# Altium integrated library Cap-Cer-SMD_V2.IntLib: 957 symbols (part 7 of 7)
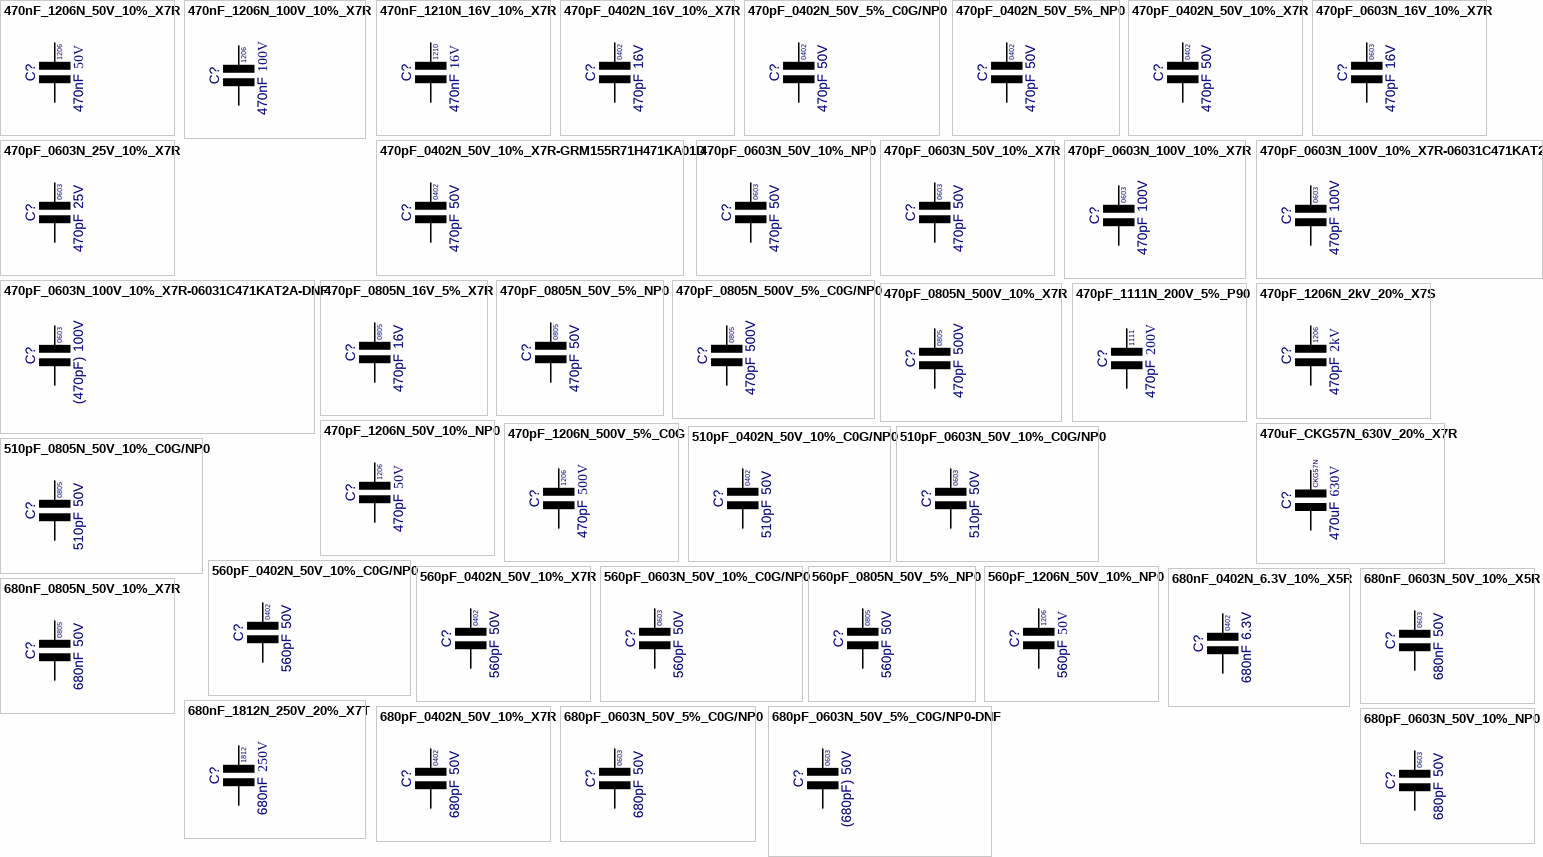
[diagram p29: symbols 470nF_1206N_50V_10%_X7R to 680pF_0603N_50V_10%_NP0]

## 470pF_0805N_16V_5%_X7R
designator C?, comment value 470pF  Voltage: 16V  Text1: 0805  (hidden comment: 470pF_C0805_16V_5%_X7R)
Cap Ceramic X7R; Manufacturer: Various; Part Number: 470pF 0805 16V 5% X7R; Tol: 5%; Package: CAPC0805X110N; EDM-PN: *; Text2: *; SAAB PN: *; DCE Part No: *
footprint CAPC0805X110N (Chip Capacitor, 0805, 2-Leads, Body 2.0x1.3mm, IPC Medium Density)
pins: 1, 2

## 470pF_0805N_50V_5%_NP0
designator C?, comment value 470pF  Voltage: 50V  Text1: 0805  (hidden comment: 470pF_C0805_50V_5%_NP0)
Cap Ceramic NP0; Manufacturer: Various; Part Number: 470pF 0805 50V 5% C0G/NP0; Tol: 5%; Package: CAPC0805X110N; EDM-PN: *; Text2: *; SAAB PN: *; DCE Part No: *
footprint CAPC0805X110N (Chip Capacitor, 0805, 2-Leads, Body 2.0x1.3mm, IPC Medium Density)
pins: 1, 2

## 470pF_0805N_500V_5%_C0G/NP0
designator C?, comment value 470pF  Voltage: 500V  Text1: 0805  (hidden comment: 470pF_C0805_500V_5%_C0G/NP0)
Cap Ceramic C0G/NP0; Manufacturer: Various; Part Number: 470pF 0805 500V 5% C0G/NP0; Tol: 5%; Package: CAPC0805X110N; EDM-PN: *; Text2: *; SAAB PN: *; DCE Part No: *
footprint CAPC0805X110N (Chip Capacitor, 0805, 2-Leads, Body 2.0x1.3mm, IPC Medium Density)
pins: 1, 2

## 470pF_0805N_500V_10%_X7R
designator C?, comment value 470pF  Voltage: 500V  Text1: 0805  (hidden comment: 470pF_C0805_500V_10%_X7R)
Cap Ceramic X7R; Manufacturer: Various; Part Number: 470pF 0805 500V 10% X7R; Tol: 10%; Package: CAPC0805X110N; EDM-PN: *; Text2: *; SAAB PN: *; DCE Part No: *
footprint CAPC0805X110N (Chip Capacitor, 0805, 2-Leads, Body 2.0x1.3mm, IPC Medium Density)
pins: 1, 2

## 470pF_1111N_200V_5%_P90
designator C?, comment value 470pF  Voltage: 200V  Text1: 1111  (hidden comment: 100B471JT200XT)
Cap Ceramic P90; Manufacturer: ATC; Tol: 5%; Part Number: 100B471JT200XT; Package: CAPC1111-100B-T; EDM-PN: *; Text2: *; SAAB PN: *; DCE Part No: *
footprint CAPC1111-100B-T (Capacitor, 1111 2.79x2.79mm)
pins: 1, 2

## 470pF_1206N_2kV_20%_X7S
designator C?, comment value 470pF  Voltage: 2kV  Text1: 1206  (hidden comment: 470pF_C1206_2kV_20%_X7S)
Cap Ceramic X7S; Manufacturer: Various; Part Number: 470pF 1206 2kV 20% X7S; Tol: 20%; Package: CAPC1206X178N; EDM-PN: *; Text2: *; SAAB PN: *; DCE Part No: *
footprint CAPC1206X178N (Chip Capacitor, 1206, 2-Leads, Body 3.2x1.6mm, IPC Medium Density)
pins: 1, 2

## 470pF_1206N_50V_10%_NP0
designator C?, comment value 470pF  Voltage: 50V  Text1: 1206  (hidden comment: 470pF_C1206_50V_10%_NP0)
Cap Ceramic NP0; Manufacturer: Various; Part Number: 470pF 1206 50V 10% C0G/NP0; Tol: 10%; Package: CAPC1206X135N; EDM-PN: *; Text2: *; SAAB PN: *; DCE Part No: *
footprint CAPC1206X135N (Chip Capacitor, 1206, 2-Leads, Body 3.2x1.6mm, IPC Medium Density)
pins: 1, 2

## 470pF_1206N_500V_5%_C0G
designator C?, comment value 470pF  Voltage: 500V  Text1: 1206  (hidden comment: 470pF_C1206_500V_5%_C0G)
Cap Ceramic C0G; Manufacturer: Various; Part Number: 470pF 1206 500V 5% C0G; Tol: 5%; Package: CAPC1206X135N; EDM-PN: *; Text2: *; SAAB PN: *; DCE Part No: *
footprint CAPC1206X135N (Chip Capacitor, 1206, 2-Leads, Body 3.2x1.6mm, IPC Medium Density)
pins: 1, 2

## 470uF_CKG57N_630V_20%_X7R
designator C?  value 470uF  Voltage: 630V  Text1: CKG57N  (hidden comment: 470uF_CKG57N_630V_20%_X7R)
Cap Ceramic X7R 2 Chip Piled; Manufacturer: TDK; Part Number: CKG57NX7R2J474M; Tol: 20%; Package: CAP-CKG57N; EDM-PN: *; Text2: *; SAAB PN: *; DCE Part No: *
footprint CAP-CKG57N (Chip Capacitor, CKG57N, 2-Leads, Body 6.5x5.5mm, IPC Medium Density)
pins: 1, 2

## 510pF_0402N_50V_10%_C0G/NP0
designator C?, comment value 510pF  Voltage: 50V  Text1: 0402  (hidden comment: 510pF_C0402_50V_10%_)
Cap Ceramic C0G/NP0; Manufacturer: Various; Part Number: 510pF 0402 50V 10% C0G/NP0; Tol: 10%; Package: CAPC0402X60N; EDM-PN: *; Text2: *; SAAB PN: *; DCE Part No: *
footprint CAPC0402X60N (Chip Capacitor, 0402, 2-Leads, Body 1.0x0.5mm, IPC Medium Density)
pins: 1, 2

## 510pF_0603N_50V_10%_C0G/NP0
designator C?, comment value 510pF  Voltage: 50V  Text1: 0603  (hidden comment: 510pF_C0603_50V_10%_C0G/NP0)
Cap Ceramic C0G/NP0; Manufacturer: Various; Part Number: 510pF 0603 50V 10% C0G/NP0; Tol: 10%; Package: CAPC0603X85N; EDM-PN: *; Text2: *; SAAB PN: *; DCE Part No: *
footprint CAPC0603X85N (Chip Capacitor, 0603, 2-Leads, Body 1.6x0.8mm, IPC Medium Density)
pins: 1, 2

## 510pF_0805N_50V_10%_C0G/NP0
designator C?, comment value 510pF  Voltage: 50V  Text1: 0805  (hidden comment: 510pF_C0805_50V_10%_C0G/NP0)
Cap Ceramic C0G/NP0; Manufacturer: Various; Part Number: 510pF 0805 50V 10% C0G/NP0; Tol: 10%; Package: CAPC0805X110N; EDM-PN: *; Text2: *; SAAB PN: *; DCE Part No: *
footprint CAPC0805X110N (Chip Capacitor, 0805, 2-Leads, Body 2.0x1.3mm, IPC Medium Density)
pins: 1, 2

## 560pF_0402N_50V_10%_C0G/NP0
designator C?, comment value 560pF  Voltage: 50V  Text1: 0402  (hidden comment: 560pF_C0402_50V_10%_C0G/NP0)
Cap Ceramic C0G/NP0; Manufacturer: Various; Part Number: 560pF 0402 50V 10% C0G/NP0; Tol: 10%; Package: CAPC0402X60N; EDM-PN: *; Text2: *; SAAB PN: *; DCE Part No: *
footprint CAPC0402X60N (Chip Capacitor, 0402, 2-Leads, Body 1.0x0.5mm, IPC Medium Density)
pins: 1, 2

## 560pF_0402N_50V_10%_X7R
designator C?, comment value 560pF  Voltage: 50V  Text1: 0402  (hidden comment: 560pF_C0402_50V_10%_X7R)
Cap Ceramic X7R; Manufacturer: Various; Part Number: 560pF 0402 50V 10% X7R; Tol: 10%; Package: CAPC0402X60N; EDM-PN: *; Text2: *; SAAB PN: *; DCE Part No: *
footprint CAPC0402X60N (Chip Capacitor, 0402, 2-Leads, Body 1.0x0.5mm, IPC Medium Density)
pins: 1, 2

## 560pF_0603N_50V_10%_C0G/NP0
designator C?, comment value 560pF  Voltage: 50V  Text1: 0603  (hidden comment: 560pF_C0603_50V_10%_C0G/NP0)
Cap Ceramic C0G/NP0; Manufacturer: Various; Part Number: 560pF 0603 50V 10% C0G/NP0; EDM-PN: CAP870; Tol: 10%; Package: CAPC0603X85N; Text2: *; SAAB PN: *; DCE Part No: *
footprint CAPC0603X85N (Chip Capacitor, 0603, 2-Leads, Body 1.6x0.8mm, IPC Medium Density)
pins: 1, 2

## 560pF_0805N_50V_5%_NP0
designator C?, comment value 560pF  Voltage: 50V  Text1: 0805  (hidden comment: 560pF_C0805_50V_5%_NP0)
Cap Ceramic NP0; Manufacturer: Various; Part Number: 560pF 0805 50V 5% NP0; Tol: 5%; Package: CAPC0805X110N; EDM-PN: *; Text2: *; SAAB PN: *; DCE Part No: *
footprint CAPC0805X110N (Chip Capacitor, 0805, 2-Leads, Body 2.0x1.3mm, IPC Medium Density)
pins: 1, 2

## 560pF_1206N_50V_10%_NP0
designator C?, comment value 560pF  Voltage: 50V  Text1: 1206  (hidden comment: 560pF_C1206_50V_10%_NP0)
Cap Ceramic NP0; Manufacturer: Various; Part Number: 560pF 1206 50V 10% NP0; Tol: 10%; Package: CAPC1206X135N; EDM-PN: *; Text2: *; SAAB PN: *; DCE Part No: *
footprint CAPC1206X135N (Chip Capacitor, 1206, 2-Leads, Body 3.2x1.6mm, IPC Medium Density)
pins: 1, 2

## 680nF_0402N_6.3V_10%_X5R
designator C?, comment value 680nF  Voltage: 6.3V  Text1: 0402  (hidden comment: 680nF_C0402_6.3V_10%_X5R)
Cap Ceramic X5R; Manufacturer: Various; Part Number: 680nF 0402 6.3V 10% X5R; EDM-PN: CAP1028; Tol: 10%; Package: CAPC0402X60N; Text2: *; SAAB PN: *; DCE Part No: *
footprint CAPC0402X60N (Chip Capacitor, 0402, 2-Leads, Body 1.0x0.5mm, IPC Medium Density)
pins: 1, 2

## 680nF_0603N_50V_10%_X5R
designator C?, comment value 680nF  Voltage: 50V  Text1: 0603  (hidden comment: 680nF_C0603_50V_10%_X5R)
Cap Ceramic X5R; Manufacturer: Various; Part Number: 680nF 0603 50V 10% X5R; Tol: 10%; Package: CAPC0603X85N; EDM-PN: *; Text2: *; SAAB PN: *; DCE Part No: *
footprint CAPC0603X85N (Chip Capacitor, 0603, 2-Leads, Body 1.6x0.8mm, IPC Medium Density)
pins: 1, 2

## 680nF_0805N_50V_10%_X7R
designator C?, comment value 680nF  Voltage: 50V  Text1: 0805  (hidden comment: 680nF_C0805_50V_10%_X7R)
Cap Ceramic X7R; Manufacturer: Various; Part Number: 680nF 0805 50V 10% X7R; EDM-PN: CAP766; Tol: 10%; Package: CAPC0805X110N; Text2: *; SAAB PN: *; DCE Part No: *
footprint CAPC0805X110N (Chip Capacitor, 0805, 2-Leads, Body 2.0x1.3mm, IPC Medium Density)
pins: 1, 2

## 680nF_1812N_250V_20%_X7T
designator C?, comment value 680nF  Voltage: 250V  Text1: 1812  (hidden comment: 680nF_C1812_250V_20%_X7T)
Cap Ceramic X7T; Manufacturer: Various; Part Number: 680nF 1812 250V 20% X7T; Tol: 20%; Package: CAPC1812X135N; EDM-PN: *; Text2: *; SAAB PN: *; DCE Part No: *
footprint CAPC1812X135N (Chip Capacitor, 1812, 2-Leads, Body 4.5x3.2mm, IPC Medium Density)
pins: 1, 2

## 680pF_0402N_50V_10%_X7R
designator C?, comment value 680pF  Voltage: 50V  Text1: 0402  (hidden comment: 680pF_C0402_50V_10%_X7R)
Cap Ceramic X7R; Manufacturer: Various; Part Number: 680pF 0402 50V 10% X7R; Tol: 10%; Package: CAPC0402X60N; EDM-PN: *; Text2: *; SAAB PN: *; DCE Part No: *
footprint CAPC0402X60N (Chip Capacitor, 0402, 2-Leads, Body 1.0x0.5mm, IPC Medium Density)
pins: 1, 2

## 680pF_0603N_50V_5%_C0G/NP0
designator C?, comment value 680pF  Voltage: 50V  Text1: 0603  (hidden comment: 680pF_C0603_50V_5%_C0G/NP0)
Cap Ceramic C0G/NP0; Manufacturer: Various; Part Number: 680pF 0603 50V 5% C0G/NP0; Tol: 5%; Package: CAPC0603X85N; EDM-PN: *; Text2: *; SAAB PN: *; DCE Part No: *
footprint CAPC0603X85N (Chip Capacitor, 0603, 2-Leads, Body 1.6x0.8mm, IPC Medium Density)
pins: 1, 2

## 680pF_0603N_50V_5%_C0G/NP0-DNF
designator C?, comment value (680pF)  Voltage: 50V  Text1: 0603  (hidden comment: 680pF_C0603_50V_5%_C0G/NP0)
Cap Ceramic C0G/NP0 - Do not Fit; Manufacturer: Various; Part Number: DNF - 680pF 0603 50V 5% C0G/NP0; Tol: 5%; Package: CAPC0603X85N; EDM-PN: *; Text2: *; SAAB PN: *; DCE Part No: *
footprint CAPC0603X85N (Chip Capacitor, 0603, 2-Leads, Body 1.6x0.8mm, IPC Medium Density)
pins: 1, 2

## 680pF_0603N_50V_10%_NP0
designator C?, comment value 680pF  Voltage: 50V  Text1: 0603  (hidden comment: 680pF_C0603_50V_10%_NP0)
Cap Ceramic NP0; Manufacturer: Various; Part Number: 680pF 0603 50V 10% NP0; Tol: 10%; Package: CAPC0603X85N; EDM-PN: *; Text2: *; SAAB PN: *; DCE Part No: *
footprint CAPC0603X85N (Chip Capacitor, 0603, 2-Leads, Body 1.6x0.8mm, IPC Medium Density)
pins: 1, 2

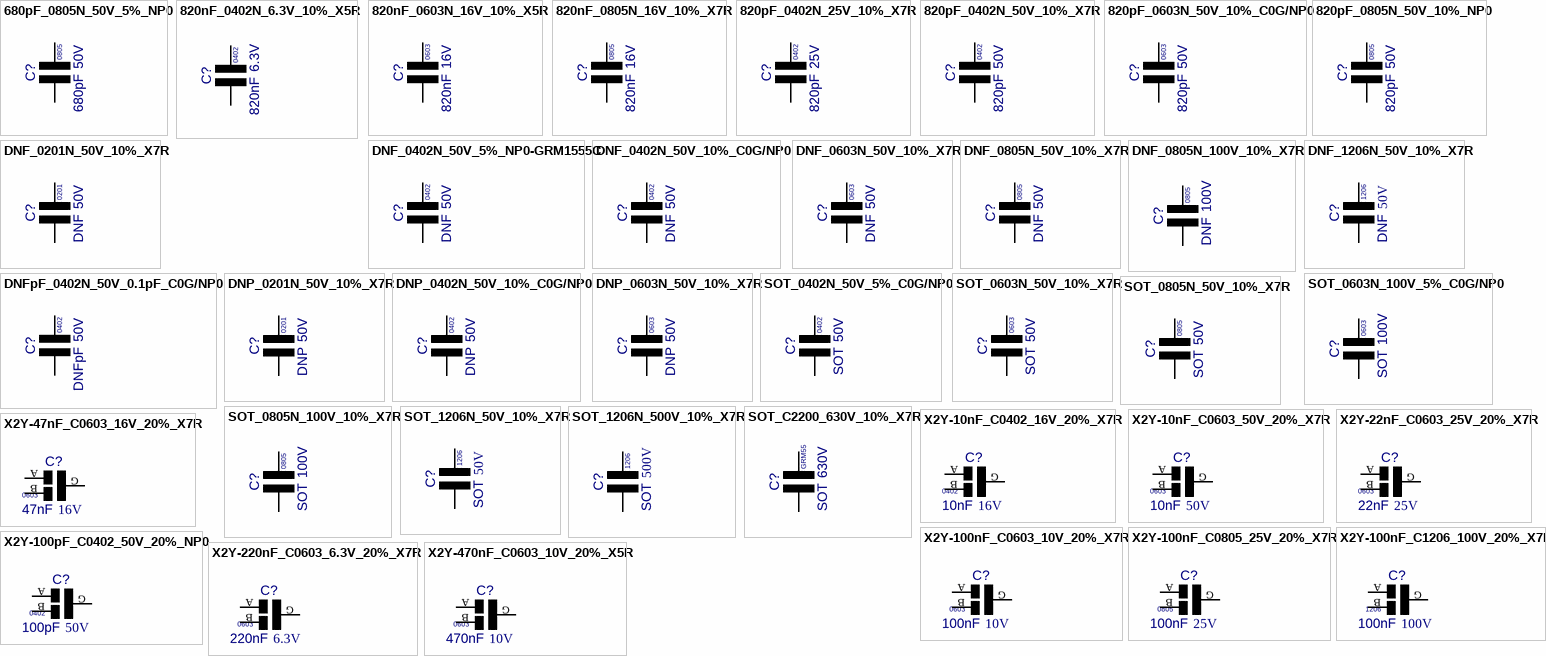
[diagram p23: symbols 680pF_0805N_50V_5%_NP0 to X2Y-470nF_C0603_10V_20%_X5R]

## 680pF_0805N_50V_5%_NP0
designator C?, comment value 680pF  Voltage: 50V  Text1: 0805  (hidden comment: 680pF_C0805_50V_5%_NP0)
Cap Ceramic NP0; Manufacturer: Various; Part Number: 680pF 0805 50V 5% NP0; Tol: 5%; Package: CAPC0805X110N; EDM-PN: *; Text2: *; SAAB PN: *; DCE Part No: *
footprint CAPC0805X110N (Chip Capacitor, 0805, 2-Leads, Body 2.0x1.3mm, IPC Medium Density)
pins: 1, 2

## 820nF_0402N_6.3V_10%_X5R
designator C?, comment value 820nF  Voltage: 6.3V  Text1: 0402  (hidden comment: 820nF_C0402_6.3V_10%_X5R)
Cap Ceramic X5R; Manufacturer: Various; Part Number: 820nF 0402 6.3V 10% X5R; EDM-PN: CAP1035; Tol: 10%; Package: CAPC0402X60N; Text2: *; SAAB PN: *; DCE Part No: *
footprint CAPC0402X60N (Chip Capacitor, 0402, 2-Leads, Body 1.0x0.5mm, IPC Medium Density)
pins: 1, 2

## 820nF_0603N_16V_10%_X5R
designator C?, comment value 820nF  Voltage: 16V  Text1: 0603  (hidden comment: 820nF_C0603_16V_10%_X5R)
Cap Ceramic X5R; Manufacturer: Various; Part Number: 820nF 0603 16V 10% X5R; Tol: 10%; Package: CAPC0603X85N; EDM-PN: *; Text2: *; SAAB PN: *; DCE Part No: *
footprint CAPC0603X85N (Chip Capacitor, 0603, 2-Leads, Body 1.6x0.8mm, IPC Medium Density)
pins: 1, 2

## 820nF_0805N_16V_10%_X7R
designator C?, comment value 820nF  Voltage: 16V  Text1: 0805  (hidden comment: 820nF_C0805_16V_10%_X7R)
Cap Ceramic X7R; Manufacturer: Various; Part Number: 820NF 0805 16V 10% X7R; Tol: 10%; Package: CAPC0805X110N; EDM-PN: *; Text2: *; SAAB PN: *; DCE Part No: *
footprint CAPC0805X110N (Chip Capacitor, 0805, 2-Leads, Body 2.0x1.3mm, IPC Medium Density)
pins: 1, 2

## 820pF_0402N_25V_10%_X7R
designator C?, comment value 820pF  Voltage: 25V  Text1: 0402  (hidden comment: 820pF_C0402_25V_10%_X7R)
Cap Ceramic X7R; Manufacturer: Various; Part Number: 820pF 0402 25V 10% X7R; Tol: 10%; Package: CAPC0402X60N; EDM-PN: *; Text2: *; SAAB PN: *; DCE Part No: *
footprint CAPC0402X60N (Chip Capacitor, 0402, 2-Leads, Body 1.0x0.5mm, IPC Medium Density)
pins: 1, 2

## 820pF_0402N_50V_10%_X7R
designator C?, comment value 820pF  Voltage: 50V  Text1: 0402  (hidden comment: 820pF_C0402_50V_10%_X7R)
Cap Ceramic X7R; Manufacturer: Various; Part Number: 820pF 0402 50V 10% X7R; Tol: 10%; Package: CAPC0402X60N; EDM-PN: *; Text2: *; SAAB PN: *; DCE Part No: *
footprint CAPC0402X60N (Chip Capacitor, 0402, 2-Leads, Body 1.0x0.5mm, IPC Medium Density)
pins: 1, 2

## 820pF_0603N_50V_10%_C0G/NP0
designator C?, comment value 820pF  Voltage: 50V  Text1: 0603  (hidden comment: 820pF_C0603_50V_10%_C0G/NP0)
Cap Ceramic C0G/NP0; Manufacturer: Various; Part Number: 820pF 0603 50V 10% C0G/NP0; EDM-PN: CAP98; Tol: 10%; Package: CAPC0603X85N; Text2: *; SAAB PN: *; DCE Part No: *
footprint CAPC0603X85N (Chip Capacitor, 0603, 2-Leads, Body 1.6x0.8mm, IPC Medium Density)
pins: 1, 2

## 820pF_0805N_50V_10%_NP0
designator C?, comment value 820pF  Voltage: 50V  Text1: 0805  (hidden comment: 820pF_C0805_50V_10%_NP0)
Cap Ceramic NP0; Manufacturer: Various; Part Number: 820pF 0805 50V 10% NP0; Tol: 10%; Package: CAPC0805X110N; EDM-PN: *; Text2: *; SAAB PN: *; DCE Part No: *
footprint CAPC0805X110N (Chip Capacitor, 0805, 2-Leads, Body 2.0x1.3mm, IPC Medium Density)
pins: 1, 2

## DNF_0201N_50V_10%_X7R
designator C?  value DNF  Voltage: 50V  Text1: 0201  (hidden comment: DNF_0201N_50V_10%_X7R)
Cap Ceramic X7R - Do not Fit; Manufacturer: Various; Part Number: DNF 0201 50V 10% X7R; Tol: 10%; Package: CAPC0201X33N; EDM-PN: DNF; Text2: *; SAAB PN: *; DCE Part No: *
footprint CAPC0201X33N (Chip Capacitor, 0201, 2-Leads, Body 0.6x0.3mm, IPC Medium Density)
pins: 1, 2

## DNF_0402N_50V_5%_NP0-GRM1555C
designator C?, comment value DNF  Voltage: 50V  Text1: 0402  (hidden comment: DNF_C0402_50V_5%_NP0)
Cap Ceramic NP0 - Do not Fit; Manufacturer: Murata; Tol: 5%; Part Number: DNF; Package: GRM155-0.20; EDM-PN: DNF; Text2: *; SAAB PN: *; DCE Part No: *
footprint GRM155-0.20 (GRM155 0402 1.0x0.5mm)
pins: 1, 2

## DNF_0402N_50V_10%_C0G/NP0
designator C?, comment value DNF  Voltage: 50V  Text1: 0402  (hidden comment: DNf_C0402_50V_10%_C0G/NP0)
Cap Ceramic C0G/NP0 - Do not Fit; Manufacturer: Various; Tol: 10%; Part Number: DNF; Package: CAPC0402X60N; EDM-PN: DNF; Text2: *; SAAB PN: *; DCE Part No: *
footprint CAPC0402X60N (Chip Capacitor, 0402, 2-Leads, Body 1.0x0.5mm, IPC Medium Density)
pins: 1, 2

## DNF_0603N_50V_10%_X7R
designator C?, comment value DNF  Voltage: 50V  Text1: 0603  (hidden comment: DNF_C0603_50V_10%_X7R)
Cap Ceramic X7R - Do not Fit; Manufacturer: Various; Tol: 10%; Part Number: DNF; Package: CAPC0603X85N; EDM-PN: DNF; Text2: *; SAAB PN: *; DCE Part No: *
footprint CAPC0603X85N (Chip Capacitor, 0603, 2-Leads, Body 1.6x0.8mm, IPC Medium Density)
pins: 1, 2

## DNF_0805N_50V_10%_X7R
designator C?, comment value DNF  Voltage: 50V  Text1: 0805  (hidden comment: DNF_C0805_50V_10%_X7R)
Cap Ceramic X7R - Do not Fit; Manufacturer: Various; Tol: 10%; Part Number: DNF; Package: CAPC0805X110N; EDM-PN: DNF; Text2: *; SAAB PN: *; DCE Part No: *
footprint CAPC0805X110N (Chip Capacitor, 0805, 2-Leads, Body 2.0x1.3mm, IPC Medium Density)
pins: 1, 2

## DNF_0805N_100V_10%_X7R
designator C?, comment value DNF  Voltage: 100V  Text1: 0805  (hidden comment: DNF_C0805_100V_10%_X7R)
Cap Ceramic X7R - Do not Fit; Manufacturer: Various; Tol: 10%; Part Number: DNF; Package: CAPC0805X110N; EDM-PN: DNF; Text2: *; SAAB PN: *; DCE Part No: *
footprint CAPC0805X110N (Chip Capacitor, 0805, 2-Leads, Body 2.0x1.3mm, IPC Medium Density)
pins: 1, 2

## DNF_1206N_50V_10%_X7R
designator C?, comment value DNF  Voltage: 50V  Text1: 1206  (hidden comment: DNF_C1206_50V_10%_X7R)
Cap Ceramic X7R - Do Not Fit; Manufacturer: Various; Part Number: DNF 1206 10V 10% X7R; Tol: 10%; Package: CAPC1206X135N; EDM-PN: DNF; Text2: *; SAAB PN: *; DCE Part No: *
footprint CAPC1206X135N (Chip Capacitor, 1206, 2-Leads, Body 3.2x1.6mm, IPC Medium Density)
pins: 1, 2

## DNFpF_0402N_50V_0.1pF_C0G/NP0
designator C?, comment value DNFpF  Voltage: 50V  Text1: 0402  (hidden comment: DNFpF_C0402_50V_0.1pF_C0G/NP0)
Cap Ceramic C0G/NP0; Manufacturer: Various; Part Number: DNFpF 0402 50V 0.1pF C0G/NP0; EDM-PN: DNF; Tol: 0.1pF; Package: CAPC0402X60N; Text2: *; SAAB PN: *; DCE Part No: *
footprint CAPC0402X60N (Chip Capacitor, 0402, 2-Leads, Body 1.0x0.5mm, IPC Medium Density)
pins: 1, 2

## DNP_0201N_50V_10%_X7R
designator C?  value DNP  Voltage: 50V  Text1: 0201  (hidden comment: DNP_0201N_50V_10%_X7R)
Cap Ceramic X7R; Manufacturer: Various; Part Number: DNP 0201 50V 10% X7R; EDM-PN: DNF; Tol: 10%; Package: CAPC0201X33N; Text2: *; SAAB PN: *; DCE Part No: *
footprint CAPC0201X33N (Chip Capacitor, 0201, 2-Leads, Body 0.6x0.3mm, IPC Medium Density)
pins: 1, 2

## DNP_0402N_50V_10%_C0G/NP0
designator C?, comment value DNP  Voltage: 50V  Text1: 0402  (hidden comment: DNP_C0402_50V_10%_C0G/NP0)
Cap Ceramic C0G/NP0; Manufacturer: Various; EDM-PN: DNF; Tol: 10%; Part Number: DNP; Package: CAPC0402X60N; Text2: *; SAAB PN: *; DCE Part No: *
footprint CAPC0402X60N (Chip Capacitor, 0402, 2-Leads, Body 1.0x0.5mm, IPC Medium Density)
pins: 1, 2

## DNP_0603N_50V_10%_X7R
designator C?, comment value DNP  Voltage: 50V  Text1: 0603  (hidden comment: DNP_C0603_50V_10%_X7R)
Cap Ceramic X7R; Manufacturer: Various; EDM-PN: DNF; Tol: 10%; Part Number: DNP; Package: CAPC0603X85N; Text2: *; SAAB PN: *; DCE Part No: *
footprint CAPC0603X85N (Chip Capacitor, 0603, 2-Leads, Body 1.6x0.8mm, IPC Medium Density)
pins: 1, 2

## SOT_0402N_50V_5%_C0G/NP0
designator C?, comment value SOT  Voltage: 50V  Text1: 0402  (hidden comment: SOT_C0402_50V_10%_C0G/NP0)
Cap Ceramic C0G/NP0 - SOT; Manufacturer: Various; Tol: 5%; Part Number: SOT; Package: CAPC0402X60N; EDM-PN: *; Text2: *; SAAB PN: *; DCE Part No: *
footprint CAPC0402X60N (Chip Capacitor, 0402, 2-Leads, Body 1.0x0.5mm, IPC Medium Density)
pins: 1, 2

## SOT_0603N_50V_10%_X7R
designator C?, comment value SOT  Voltage: 50V  Text1: 0603  (hidden comment: SOT_C0603_50V_10%_X7R)
Cap Ceramic X7R; Manufacturer: Various; Tol: 10%; Part Number: SOT; Package: CAPC0603X85N; EDM-PN: *; Text2: *; SAAB PN: *; DCE Part No: *
footprint CAPC0603X85N (Chip Capacitor, 0603, 2-Leads, Body 1.6x0.8mm, IPC Medium Density)
pins: 1, 2

## SOT_0603N_100V_5%_C0G/NP0
designator C?, comment value SOT  Voltage: 100V  Text1: 0603  (hidden comment: SOT_C0603_100V_5%_C0G/NP0)
Cap Ceramic C0G/NP0; Manufacturer: Various; Tol: 5%; Part Number: SOT; Package: CAPC0603X85N; EDM-PN: *; Text2: *; SAAB PN: *; DCE Part No: *
footprint CAPC0603X85N (Chip Capacitor, 0603, 2-Leads, Body 1.6x0.8mm, IPC Medium Density)
pins: 1, 2

## SOT_0805N_50V_10%_X7R
designator C?, comment value SOT  Voltage: 50V  Text1: 0805  (hidden comment: SOT_C0805_50V_10%_X7R)
Cap Ceramic X7R; Manufacturer: Various; Tol: 10%; Part Number: SOT; Package: CAPC0805X110N; EDM-PN: *; Text2: *; SAAB PN: *; DCE Part No: *
footprint CAPC0805X110N (Chip Capacitor, 0805, 2-Leads, Body 2.0x1.3mm, IPC Medium Density)
pins: 1, 2

## SOT_0805N_100V_10%_X7R
designator C?, comment value SOT  Voltage: 100V  Text1: 0805  (hidden comment: SOT_C0805_100V_10%_X7R)
Cap Ceramic X7R; Manufacturer: Various; Tol: 10%; Part Number: SOT; Package: CAPC0805X110N; EDM-PN: *; Text2: *; SAAB PN: *; DCE Part No: *
footprint CAPC0805X110N (Chip Capacitor, 0805, 2-Leads, Body 2.0x1.3mm, IPC Medium Density)
pins: 1, 2

## SOT_1206N_50V_10%_X7R
designator C?, comment value SOT  Voltage: 50V  Text1: 1206  (hidden comment: SOT_C1206_50V_10%_X7R)
Cap Ceramic X7R; Manufacturer: Various; Part Number: SOT 1206 50V 10% X7R; Tol: 10%; Package: CAPC1206X135N; EDM-PN: *; Text2: *; SAAB PN: *; DCE Part No: *
footprint CAPC1206X135N (Chip Capacitor, 1206, 2-Leads, Body 3.2x1.6mm, IPC Medium Density)
pins: 1, 2

## SOT_1206N_500V_10%_X7R
designator C?, comment value SOT  Voltage: 500V  Text1: 1206  (hidden comment: SOT_C1206_500V_10%_X7R)
Cap Ceramic X7R; Manufacturer: Various; Part Number: SOT 1206 500V 10% X7R; Tol: 10%; Package: CAPC1206X135N; EDM-PN: *; Text2: *; SAAB PN: *; DCE Part No: *
footprint CAPC1206X135N (Chip Capacitor, 1206, 2-Leads, Body 3.2x1.6mm, IPC Medium Density)
pins: 1, 2

## SOT_C2200_630V_10%_X7R
designator C?, comment value SOT  Voltage: 630V  Text1: GRM55  (hidden comment: SOT_GRM55_630V_10%_X7R)
Cap Ceramic X7R; Manufacturer: Murata; Tol: 10%; Part Number: SOT; Package: C2220; EDM-PN: *; Text2: *; SAAB PN: *; DCE Part No: *
footprint CAPC2220x220 (Chip Capacitor, 2220, 2-Leads, Body 5.6x5.0mm)
pins: 1, 2

## X2Y-10nF_C0402_16V_20%_X7R
designator C?  value 10nF  Voltage: 16V  Text1: 0402  (hidden comment: X2Y-10nF_C0402_16V_20%_X7R)
Cap Ceramic X2Y; Manufacturer: Johanson; Part Number: 160X07W103MV4T; Tol: 20%; Package: CAPC0402-X2Y; EDM-PN: *; Text2: *; SAAB PN: *; DCE Part No: *
footprint CAPC0402-X2Y (Cap 0402 X2Y 1.1x0.6mm)
pins: A, B, G

## X2Y-10nF_C0603_50V_20%_X7R
designator C?  value 10nF  Voltage: 50V  Text1: 0603  (hidden comment: X2Y-10nF_C0603_50V_20%_X7R)
Cap Ceramic X2Y; Manufacturer: Johanson; Part Number: 500X14W103MV4T; Tol: 20%; Package: CAPC0603-X2Y; EDM-PN: *; Text2: *; SAAB PN: *; DCE Part No: *
footprint CAPC0603-X2Y (Cap 0603 X2Y 1.6x0.89mm)
pins: A, B, G

## X2Y-22nF_C0603_25V_20%_X7R
designator C?  value 22nF  Voltage: 25V  Text1: 0603  (hidden comment: X2Y-22nF_C0603_25V_20%_X7R)
Cap Ceramic X2Y; Manufacturer: Johanson; Part Number: 250X14W223MV4T; Tol: 20%; Package: CAPC0603-X2Y; EDM-PN: *; Text2: *; SAAB PN: *; DCE Part No: *
footprint CAPC0603-X2Y (Cap 0603 X2Y 1.6x0.89mm)
pins: A, B, G

## X2Y-47nF_C0603_16V_20%_X7R
designator C?  value 47nF  Voltage: 16V  Text1: 0603  (hidden comment: X2Y-47nF_C0603_16V_20%_X7R)
Cap Ceramic X2Y; Manufacturer: Johanson; Part Number: 160X14W473MV4T; Tol: 20%; Package: CAPC0603-X2Y; EDM-PN: *; Text2: *; SAAB PN: *; DCE Part No: *
footprint CAPC0603-X2Y (Cap 0603 X2Y 1.6x0.89mm)
pins: A, B, G

## X2Y-100nF_C0603_10V_20%_X7R
designator C?  value 100nF  Voltage: 10V  Text1: 0603  (hidden comment: X2Y-100nF_C0603_10V_20%_X7R)
Cap Ceramic X2Y; Manufacturer: Johanson; Part Number: 100X14W104MV4T; Tol: 20%; Package: CAPC0603-X2Y; EDM-PN: *; Text2: *; SAAB PN: *; DCE Part No: *
footprint CAPC0603-X2Y (Cap 0603 X2Y 1.6x0.89mm)
pins: A, B, G

## X2Y-100nF_C0805_25V_20%_X7R
designator C?  value 100nF  Voltage: 25V  Text1: 0805  (hidden comment: X2Y-100nF_C0805_25V_20%_X7R)
Cap Ceramic X2Y; Manufacturer: Johanson; Part Number: 250X15W104MV4E; Tol: 20%; Package: CAPC0805-X2Y; EDM-PN: *; Text2: *; SAAB PN: *; DCE Part No: *
footprint CAPC0805-X2Y (Cap 0805 X2Y 2.0x1.27mm)
pins: A, B, G

## X2Y-100nF_C1206_100V_20%_X7R
designator C?  value 100nF  Voltage: 100V  Text1: 1206  (hidden comment: X2Y-100nF_C1206_100V_20%_X7R)
Cap Ceramic X2Y; Manufacturer: Johanson; Part Number: 101X18W104MV4E; Tol: 20%; Package: CAPC1206-X2Y; EDM-PN: *; Text2: *; SAAB PN: *; DCE Part No: *
footprint CAPC1206-X2Y (Cap 1206 X2Y 3.1x1.6mm)
pins: A, B, G

## X2Y-100pF_C0402_50V_20%_NP0
designator C?  value 100pF  Voltage: 50V  Text1: 0402  (hidden comment: X2Y-100pF_C0402_50V_20%_NP0)
Cap Ceramic X2Y; Manufacturer: Johanson; Part Number: 500X07N101MV4T; Tol: 20%; Package: CAPC0402-X2Y; EDM-PN: *; Text2: *; SAAB PN: *; DCE Part No: *
footprint CAPC0402-X2Y (Cap 0402 X2Y 1.1x0.6mm)
pins: A, B, G

## X2Y-220nF_C0603_6.3V_20%_X7R
designator C?  value 220nF  Voltage: 6.3V  Text1: 0603  (hidden comment: X2Y-220nF_C0603_6.3V_20%_X7R)
Cap Ceramic X2Y; Manufacturer: Johanson; Part Number: 6.3X14W224MV4T; Tol: 20%; Package: CAPC0603-X2Y; EDM-PN: *; Text2: *; SAAB PN: *; DCE Part No: *
footprint CAPC0603-X2Y (Cap 0603 X2Y 1.6x0.89mm)
pins: A, B, G

## X2Y-470nF_C0603_10V_20%_X5R
designator C?  value 470nF  Voltage: 10V  Text1: 0603  (hidden comment: X2Y-470nF_C0603_10V_20%_X5R)
Cap Ceramic X2Y; Manufacturer: Johanson; Part Number: 100X14X474MV4T; Tol: 20%; Package: CAPC0603-X2Y; EDM-PN: *; Text2: *; SAAB PN: *; DCE Part No: *
footprint CAPC0603-X2Y (Cap 0603 X2Y 1.6x0.89mm)
pins: A, B, G